# Altium integrated library all_in_one_library.IntLib: 677 symbols (part 2 of 3) (continued)
## RES_1k5_5%_0805
designator R?, comment value 1k5  (hidden comment: Thick film)
1500.00; Tolerance [%]: ±5; Power Rating [W]: 0.1; Case [EIA]: 0805; Case [Metric]: 2012; Value [Ω]: 1500.00
footprint RES_0805
pins: 1, 2
1 alternate drawing of the same symbol

## RES_1k6_5%_0603
designator R?, comment value 1k6  (hidden comment: Thick film)
1600.00; Tolerance [%]: ±5; Power Rating [W]: 0.1; Case [EIA]: 0603; Case [Metric]: 1608; Value [Ω]: 1600.00
footprint RES_0603
pins: 1, 2
1 alternate drawing of the same symbol

## RES_1k6_5%_0805
designator R?, comment value 1k6  (hidden comment: Thick film)
1600.00; Tolerance [%]: ±5; Power Rating [W]: 0.1; Case [EIA]: 0805; Case [Metric]: 2012; Value [Ω]: 1600.00
footprint RES_0805
pins: 1, 2
1 alternate drawing of the same symbol

## RES_1k8_5%_0603
designator R?, comment value 1k8  (hidden comment: Thick film)
1800.00; Tolerance [%]: ±5; Power Rating [W]: 0.1; Case [EIA]: 0603; Case [Metric]: 1608; Value [Ω]: 1800.00
footprint RES_0603
pins: 1, 2
1 alternate drawing of the same symbol

## RES_1k8_5%_0805
designator R?, comment value 1k8  (hidden comment: Thick film)
1800.00; Tolerance [%]: ±5; Power Rating [W]: 0.1; Case [EIA]: 0805; Case [Metric]: 2012; Value [Ω]: 1800.00
footprint RES_0805
pins: 1, 2
1 alternate drawing of the same symbol

## RES_1M5_1%_2512
designator R?, comment 1M5 1W
1500000.00
footprint RES_2512
footprint RES_2512_Cool
pins: 1, 2
1 alternate drawing of the same symbol

## RES_1M_5%_0603
designator R?, comment value 1M  (hidden comment: Thick film)
1000000.00; Tolerance [%]: ±5; Power Rating [W]: 0.1; Case [EIA]: 0603; Case [Metric]: 1608; Value [Ω]: 1000000.00
footprint RES_0603
pins: 1, 2
1 alternate drawing of the same symbol

## RES_1M_5%_0805
designator R?, comment value 1M  (hidden comment: Thick film)
1000000.00; Tolerance [%]: ±5; Power Rating [W]: 0.1; Case [EIA]: 0805; Case [Metric]: 2012; Value [Ω]: 1000000.00
footprint RES_0805
pins: 1, 2
1 alternate drawing of the same symbol

## RES_1R0_5%_0603
designator R?, comment value 1R  (hidden comment: Thick film)
1.00; Tolerance [%]: ±5; Power Rating [W]: 0.1; Case [EIA]: 0603; Case [Metric]: 1608; Value [Ω]: 1.00
footprint RES_0603
pins: 1, 2
1 alternate drawing of the same symbol

## RES_1R0_5%_0805
designator R?, comment value 1R  (hidden comment: Thick film)
1.00; Tolerance [%]: ±5; Power Rating [W]: 0.1; Case [EIA]: 0805; Case [Metric]: 2012; Value [Ω]: 1.00
footprint RES_0805
pins: 1, 2
1 alternate drawing of the same symbol

## RES_1R1_5%_0603
designator R?, comment value 1R1  (hidden comment: Thick film)
1.10; Tolerance [%]: ±5; Power Rating [W]: 0.1; Case [EIA]: 0603; Case [Metric]: 1608; Value [Ω]: 1.10
footprint RES_0603
pins: 1, 2
1 alternate drawing of the same symbol

## RES_1R1_5%_0805
designator R?, comment value 1R1  (hidden comment: Thick film)
1.10; Tolerance [%]: ±5; Power Rating [W]: 0.1; Case [EIA]: 0805; Case [Metric]: 2012; Value [Ω]: 1.10
footprint RES_0805
pins: 1, 2
1 alternate drawing of the same symbol

## RES_1R2_5%_0603
designator R?, comment value 1R2  (hidden comment: Thick film)
1.20; Tolerance [%]: ±5; Power Rating [W]: 0.1; Case [EIA]: 0603; Case [Metric]: 1608; Value [Ω]: 1.20
footprint RES_0603
pins: 1, 2
1 alternate drawing of the same symbol

## RES_1R2_5%_0805
designator R?, comment value 1R2  (hidden comment: Thick film)
1.20; Tolerance [%]: ±5; Power Rating [W]: 0.1; Case [EIA]: 0805; Case [Metric]: 2012; Value [Ω]: 1.20
footprint RES_0805
pins: 1, 2
1 alternate drawing of the same symbol

## RES_1R3_5%_0603
designator R?, comment value 1R3  (hidden comment: Thick film)
1.30; Tolerance [%]: ±5; Power Rating [W]: 0.1; Case [EIA]: 0603; Case [Metric]: 1608; Value [Ω]: 1.30
footprint RES_0603
pins: 1, 2
1 alternate drawing of the same symbol

## RES_1R3_5%_0805
designator R?, comment value 1R3  (hidden comment: Thick film)
1.30; Tolerance [%]: ±5; Power Rating [W]: 0.1; Case [EIA]: 0805; Case [Metric]: 2012; Value [Ω]: 1.30
footprint RES_0805
pins: 1, 2
1 alternate drawing of the same symbol

## RES_1R5_5%_0603
designator R?, comment value 1R5  (hidden comment: Thick film)
1.50; Tolerance [%]: ±5; Power Rating [W]: 0.1; Case [EIA]: 0603; Case [Metric]: 1608; Value [Ω]: 1.50
footprint RES_0603
pins: 1, 2
1 alternate drawing of the same symbol

## RES_1R5_5%_0805
designator R?, comment value 1R5  (hidden comment: Thick film)
1.50; Tolerance [%]: ±5; Power Rating [W]: 0.1; Case [EIA]: 0805; Case [Metric]: 2012; Value [Ω]: 1.50
footprint RES_0805
pins: 1, 2
1 alternate drawing of the same symbol

## RES_1R6_5%_0603
designator R?, comment value 1R6  (hidden comment: Thick film)
1.60; Tolerance [%]: ±5; Power Rating [W]: 0.1; Case [EIA]: 0603; Case [Metric]: 1608; Value [Ω]: 1.60
footprint RES_0603
pins: 1, 2
1 alternate drawing of the same symbol

## RES_1R6_5%_0805
designator R?, comment value 1R6  (hidden comment: Thick film)
1.60; Tolerance [%]: ±5; Power Rating [W]: 0.1; Case [EIA]: 0805; Case [Metric]: 2012; Value [Ω]: 1.60
footprint RES_0805
pins: 1, 2
1 alternate drawing of the same symbol

## RES_1R8_5%_0603
designator R?, comment value 1R8  (hidden comment: Thick film)
1.80; Tolerance [%]: ±5; Power Rating [W]: 0.1; Case [EIA]: 0603; Case [Metric]: 1608; Value [Ω]: 1.80
footprint RES_0603
pins: 1, 2
1 alternate drawing of the same symbol

## RES_1R8_5%_0805
designator R?, comment value 1R8  (hidden comment: Thick film)
1.80; Tolerance [%]: ±5; Power Rating [W]: 0.1; Case [EIA]: 0805; Case [Metric]: 2012; Value [Ω]: 1.80
footprint RES_0805
pins: 1, 2
1 alternate drawing of the same symbol

## RES_2k0_5%_0603
designator R?, comment value 2k  (hidden comment: Thick film)
2000.00; Tolerance [%]: ±5; Power Rating [W]: 0.1; Case [EIA]: 0603; Case [Metric]: 1608; Value [Ω]: 2000.00
footprint RES_0603
pins: 1, 2
1 alternate drawing of the same symbol

## RES_2k0_5%_0805
designator R?, comment value 2k  (hidden comment: Thick film)
2000.00; Tolerance [%]: ±5; Power Rating [W]: 0.1; Case [EIA]: 0805; Case [Metric]: 2012; Value [Ω]: 2000.00
footprint RES_0805
pins: 1, 2
1 alternate drawing of the same symbol

## RES_2k2_5%_0603
designator R?, comment value 2k2  (hidden comment: Thick film)
2200.00; Tolerance [%]: ±5; Power Rating [W]: 0.1; Case [EIA]: 0603; Case [Metric]: 1608; Value [Ω]: 2200.00
footprint RES_0603
pins: 1, 2
1 alternate drawing of the same symbol

## RES_2k2_5%_0805
designator R?, comment value 2k2  (hidden comment: Thick film)
2200.00; Tolerance [%]: ±5; Power Rating [W]: 0.1; Case [EIA]: 0805; Case [Metric]: 2012; Value [Ω]: 2200.00
footprint RES_0805
pins: 1, 2
1 alternate drawing of the same symbol

## RES_2k4_5%_0603
designator R?, comment value 2k4  (hidden comment: Thick film)
2400.00; Tolerance [%]: ±5; Power Rating [W]: 0.1; Case [EIA]: 0603; Case [Metric]: 1608; Value [Ω]: 2400.00
footprint RES_0603
pins: 1, 2
1 alternate drawing of the same symbol

## RES_2k4_5%_0805
designator R?, comment value 2k4  (hidden comment: Thick film)
2400.00; Tolerance [%]: ±5; Power Rating [W]: 0.1; Case [EIA]: 0805; Case [Metric]: 2012; Value [Ω]: 2400.00
footprint RES_0805
pins: 1, 2
1 alternate drawing of the same symbol

## RES_2k7_5%_0603
designator R?, comment value 2k7  (hidden comment: Thick film)
2700.00; Tolerance [%]: ±5; Power Rating [W]: 0.1; Case [EIA]: 0603; Case [Metric]: 1608; Value [Ω]: 2700.00
footprint RES_0603
pins: 1, 2
1 alternate drawing of the same symbol

## RES_2k7_5%_0805
designator R?, comment value 2k7  (hidden comment: Thick film)
2700.00; Tolerance [%]: ±5; Power Rating [W]: 0.1; Case [EIA]: 0805; Case [Metric]: 2012; Value [Ω]: 2700.00
footprint RES_0805
pins: 1, 2
1 alternate drawing of the same symbol

## RES_2R0_5%_0603
designator R?, comment value 2R  (hidden comment: Thick film)
2.00; Tolerance [%]: ±5; Power Rating [W]: 0.1; Case [EIA]: 0603; Case [Metric]: 1608; Value [Ω]: 2.00
footprint RES_0603
pins: 1, 2
1 alternate drawing of the same symbol

## RES_2R0_5%_0805
designator R?, comment value 2R  (hidden comment: Thick film)
2.00; Tolerance [%]: ±5; Power Rating [W]: 0.1; Case [EIA]: 0805; Case [Metric]: 2012; Value [Ω]: 2.00
footprint RES_0805
pins: 1, 2
1 alternate drawing of the same symbol

## RES_2R2_5%_0603
designator R?, comment value 2R2  (hidden comment: Thick film)
2.20; Tolerance [%]: ±5; Power Rating [W]: 0.1; Case [EIA]: 0603; Case [Metric]: 1608; Value [Ω]: 2.20
footprint RES_0603
pins: 1, 2
1 alternate drawing of the same symbol

## RES_2R2_5%_0805
designator R?, comment value 2R2  (hidden comment: Thick film)
2.20; Tolerance [%]: ±5; Power Rating [W]: 0.1; Case [EIA]: 0805; Case [Metric]: 2012; Value [Ω]: 2.20
footprint RES_0805
pins: 1, 2
1 alternate drawing of the same symbol

## RES_2R4_5%_0603
designator R?, comment value 2R4  (hidden comment: Thick film)
2.40; Tolerance [%]: ±5; Power Rating [W]: 0.1; Case [EIA]: 0603; Case [Metric]: 1608; Value [Ω]: 2.40
footprint RES_0603
pins: 1, 2
1 alternate drawing of the same symbol

## RES_2R4_5%_0805
designator R?, comment value 2R4  (hidden comment: Thick film)
2.40; Tolerance [%]: ±5; Power Rating [W]: 0.1; Case [EIA]: 0805; Case [Metric]: 2012; Value [Ω]: 2.40
footprint RES_0805
pins: 1, 2
1 alternate drawing of the same symbol

## RES_2R7_5%_0603
designator R?, comment value 2R7  (hidden comment: Thick film)
2.70; Tolerance [%]: ±5; Power Rating [W]: 0.1; Case [EIA]: 0603; Case [Metric]: 1608; Value [Ω]: 2.70
footprint RES_0603
pins: 1, 2
1 alternate drawing of the same symbol

## RES_2R7_5%_0805
designator R?, comment value 2R7  (hidden comment: Thick film)
2.70; Tolerance [%]: ±5; Power Rating [W]: 0.1; Case [EIA]: 0805; Case [Metric]: 2012; Value [Ω]: 2.70
footprint RES_0805
pins: 1, 2
1 alternate drawing of the same symbol

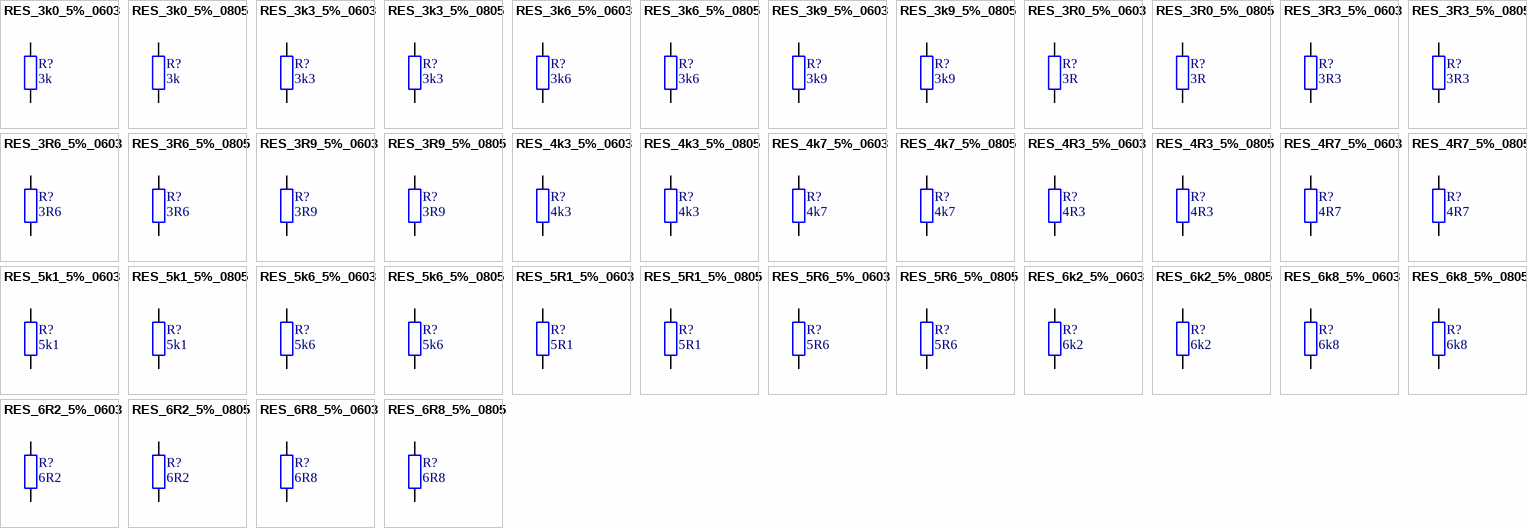
[diagram p10: symbols RES_3k0_5%_0603 to RES_6R8_5%_0805]

## RES_3k0_5%_0603
designator R?, comment value 3k  (hidden comment: Thick film)
3000.00; Tolerance [%]: ±5; Power Rating [W]: 0.1; Case [EIA]: 0603; Case [Metric]: 1608; Value [Ω]: 3000.00
footprint RES_0603
pins: 1, 2
1 alternate drawing of the same symbol

## RES_3k0_5%_0805
designator R?, comment value 3k  (hidden comment: Thick film)
3000.00; Tolerance [%]: ±5; Power Rating [W]: 0.1; Case [EIA]: 0805; Case [Metric]: 2012; Value [Ω]: 3000.00
footprint RES_0805
pins: 1, 2
1 alternate drawing of the same symbol

## RES_3k3_5%_0603
designator R?, comment value 3k3  (hidden comment: Thick film)
3300.00; Tolerance [%]: ±5; Power Rating [W]: 0.1; Case [EIA]: 0603; Case [Metric]: 1608; Value [Ω]: 3300.00
footprint RES_0603
pins: 1, 2
1 alternate drawing of the same symbol

## RES_3k3_5%_0805
designator R?, comment value 3k3  (hidden comment: Thick film)
3300.00; Tolerance [%]: ±5; Power Rating [W]: 0.1; Case [EIA]: 0805; Case [Metric]: 2012; Value [Ω]: 3300.00
footprint RES_0805
pins: 1, 2
1 alternate drawing of the same symbol

## RES_3k6_5%_0603
designator R?, comment value 3k6  (hidden comment: Thick film)
3600.00; Tolerance [%]: ±5; Power Rating [W]: 0.1; Case [EIA]: 0603; Case [Metric]: 1608; Value [Ω]: 3600.00
footprint RES_0603
pins: 1, 2
1 alternate drawing of the same symbol

## RES_3k6_5%_0805
designator R?, comment value 3k6  (hidden comment: Thick film)
3600.00; Tolerance [%]: ±5; Power Rating [W]: 0.1; Case [EIA]: 0805; Case [Metric]: 2012; Value [Ω]: 3600.00
footprint RES_0805
pins: 1, 2
1 alternate drawing of the same symbol

## RES_3k9_5%_0603
designator R?, comment value 3k9  (hidden comment: Thick film)
3900.00; Tolerance [%]: ±5; Power Rating [W]: 0.1; Case [EIA]: 0603; Case [Metric]: 1608; Value [Ω]: 3900.00
footprint RES_0603
pins: 1, 2
1 alternate drawing of the same symbol

## RES_3k9_5%_0805
designator R?, comment value 3k9  (hidden comment: Thick film)
3900.00; Tolerance [%]: ±5; Power Rating [W]: 0.1; Case [EIA]: 0805; Case [Metric]: 2012; Value [Ω]: 3900.00
footprint RES_0805
pins: 1, 2
1 alternate drawing of the same symbol

## RES_3R0_5%_0603
designator R?, comment value 3R  (hidden comment: Thick film)
3.00; Tolerance [%]: ±5; Power Rating [W]: 0.1; Case [EIA]: 0603; Case [Metric]: 1608; Value [Ω]: 3.00
footprint RES_0603
pins: 1, 2
1 alternate drawing of the same symbol

## RES_3R0_5%_0805
designator R?, comment value 3R  (hidden comment: Thick film)
3.00; Tolerance [%]: ±5; Power Rating [W]: 0.1; Case [EIA]: 0805; Case [Metric]: 2012; Value [Ω]: 3.00
footprint RES_0805
pins: 1, 2
1 alternate drawing of the same symbol

## RES_3R3_5%_0603
designator R?, comment value 3R3  (hidden comment: Thick film)
3.30; Tolerance [%]: ±5; Power Rating [W]: 0.1; Case [EIA]: 0603; Case [Metric]: 1608; Value [Ω]: 3.30
footprint RES_0603
pins: 1, 2
1 alternate drawing of the same symbol

## RES_3R3_5%_0805
designator R?, comment value 3R3  (hidden comment: Thick film)
3.30; Tolerance [%]: ±5; Power Rating [W]: 0.1; Case [EIA]: 0805; Case [Metric]: 2012; Value [Ω]: 3.30
footprint RES_0805
pins: 1, 2
1 alternate drawing of the same symbol

## RES_3R6_5%_0603
designator R?, comment value 3R6  (hidden comment: Thick film)
3.60; Tolerance [%]: ±5; Power Rating [W]: 0.1; Case [EIA]: 0603; Case [Metric]: 1608; Value [Ω]: 3.60
footprint RES_0603
pins: 1, 2
1 alternate drawing of the same symbol

## RES_3R6_5%_0805
designator R?, comment value 3R6  (hidden comment: Thick film)
3.60; Tolerance [%]: ±5; Power Rating [W]: 0.1; Case [EIA]: 0805; Case [Metric]: 2012; Value [Ω]: 3.60
footprint RES_0805
pins: 1, 2
1 alternate drawing of the same symbol

## RES_3R9_5%_0603
designator R?, comment value 3R9  (hidden comment: Thick film)
3.90; Tolerance [%]: ±5; Power Rating [W]: 0.1; Case [EIA]: 0603; Case [Metric]: 1608; Value [Ω]: 3.90
footprint RES_0603
pins: 1, 2
1 alternate drawing of the same symbol

## RES_3R9_5%_0805
designator R?, comment value 3R9  (hidden comment: Thick film)
3.90; Tolerance [%]: ±5; Power Rating [W]: 0.1; Case [EIA]: 0805; Case [Metric]: 2012; Value [Ω]: 3.90
footprint RES_0805
pins: 1, 2
1 alternate drawing of the same symbol

## RES_4k3_5%_0603
designator R?, comment value 4k3  (hidden comment: Thick film)
4300.00; Tolerance [%]: ±5; Power Rating [W]: 0.1; Case [EIA]: 0603; Case [Metric]: 1608; Value [Ω]: 4300.00
footprint RES_0603
pins: 1, 2
1 alternate drawing of the same symbol

## RES_4k3_5%_0805
designator R?, comment value 4k3  (hidden comment: Thick film)
4300.00; Tolerance [%]: ±5; Power Rating [W]: 0.1; Case [EIA]: 0805; Case [Metric]: 2012; Value [Ω]: 4300.00
footprint RES_0805
pins: 1, 2
1 alternate drawing of the same symbol

## RES_4k7_5%_0603
designator R?, comment value 4k7  (hidden comment: Thick film)
4700.00; Tolerance [%]: ±5; Power Rating [W]: 0.1; Case [EIA]: 0603; Case [Metric]: 1608; Value [Ω]: 4700.00
footprint RES_0603
pins: 1, 2
1 alternate drawing of the same symbol

## RES_4k7_5%_0805
designator R?, comment value 4k7  (hidden comment: Thick film)
4700.00; Tolerance [%]: ±5; Power Rating [W]: 0.1; Case [EIA]: 0805; Case [Metric]: 2012; Value [Ω]: 4700.00
footprint RES_0805
pins: 1, 2
1 alternate drawing of the same symbol

## RES_4R3_5%_0603
designator R?, comment value 4R3  (hidden comment: Thick film)
4.30; Tolerance [%]: ±5; Power Rating [W]: 0.1; Case [EIA]: 0603; Case [Metric]: 1608; Value [Ω]: 4.30
footprint RES_0603
pins: 1, 2
1 alternate drawing of the same symbol

## RES_4R3_5%_0805
designator R?, comment value 4R3  (hidden comment: Thick film)
4.30; Tolerance [%]: ±5; Power Rating [W]: 0.1; Case [EIA]: 0805; Case [Metric]: 2012; Value [Ω]: 4.30
footprint RES_0805
pins: 1, 2
1 alternate drawing of the same symbol

## RES_4R7_5%_0603
designator R?, comment value 4R7  (hidden comment: Thick film)
4.70; Tolerance [%]: ±5; Power Rating [W]: 0.1; Case [EIA]: 0603; Case [Metric]: 1608; Value [Ω]: 4.70
footprint RES_0603
pins: 1, 2
1 alternate drawing of the same symbol

## RES_4R7_5%_0805
designator R?, comment value 4R7  (hidden comment: Thick film)
4.70; Tolerance [%]: ±5; Power Rating [W]: 0.1; Case [EIA]: 0805; Case [Metric]: 2012; Value [Ω]: 4.70
footprint RES_0805
pins: 1, 2
1 alternate drawing of the same symbol

## RES_5k1_5%_0603
designator R?, comment value 5k1  (hidden comment: Thick film)
5100.00; Tolerance [%]: ±5; Power Rating [W]: 0.1; Case [EIA]: 0603; Case [Metric]: 1608; Value [Ω]: 5100.00
footprint RES_0603
pins: 1, 2
1 alternate drawing of the same symbol

## RES_5k1_5%_0805
designator R?, comment value 5k1  (hidden comment: Thick film)
5100.00; Tolerance [%]: ±5; Power Rating [W]: 0.1; Case [EIA]: 0805; Case [Metric]: 2012; Value [Ω]: 5100.00
footprint RES_0805
pins: 1, 2
1 alternate drawing of the same symbol

## RES_5k6_5%_0603
designator R?, comment value 5k6  (hidden comment: Thick film)
5600.00; Tolerance [%]: ±5; Power Rating [W]: 0.1; Case [EIA]: 0603; Case [Metric]: 1608; Value [Ω]: 5600.00
footprint RES_0603
pins: 1, 2
1 alternate drawing of the same symbol

## RES_5k6_5%_0805
designator R?, comment value 5k6  (hidden comment: Thick film)
5600.00; Tolerance [%]: ±5; Power Rating [W]: 0.1; Case [EIA]: 0805; Case [Metric]: 2012; Value [Ω]: 5600.00
footprint RES_0805
pins: 1, 2
1 alternate drawing of the same symbol

## RES_5R1_5%_0603
designator R?, comment value 5R1  (hidden comment: Thick film)
5.10; Tolerance [%]: ±5; Power Rating [W]: 0.1; Case [EIA]: 0603; Case [Metric]: 1608; Value [Ω]: 5.10
footprint RES_0603
pins: 1, 2
1 alternate drawing of the same symbol

## RES_5R1_5%_0805
designator R?, comment value 5R1  (hidden comment: Thick film)
5.10; Tolerance [%]: ±5; Power Rating [W]: 0.1; Case [EIA]: 0805; Case [Metric]: 2012; Value [Ω]: 5.10
footprint RES_0805
pins: 1, 2
1 alternate drawing of the same symbol

## RES_5R6_5%_0603
designator R?, comment value 5R6  (hidden comment: Thick film)
5.60; Tolerance [%]: ±5; Power Rating [W]: 0.1; Case [EIA]: 0603; Case [Metric]: 1608; Value [Ω]: 5.60
footprint RES_0603
pins: 1, 2
1 alternate drawing of the same symbol

## RES_5R6_5%_0805
designator R?, comment value 5R6  (hidden comment: Thick film)
5.60; Tolerance [%]: ±5; Power Rating [W]: 0.1; Case [EIA]: 0805; Case [Metric]: 2012; Value [Ω]: 5.60
footprint RES_0805
pins: 1, 2
1 alternate drawing of the same symbol

## RES_6k2_5%_0603
designator R?, comment value 6k2  (hidden comment: Thick film)
6200.00; Tolerance [%]: ±5; Power Rating [W]: 0.1; Case [EIA]: 0603; Case [Metric]: 1608; Value [Ω]: 6200.00
footprint RES_0603
pins: 1, 2
1 alternate drawing of the same symbol

## RES_6k2_5%_0805
designator R?, comment value 6k2  (hidden comment: Thick film)
6200.00; Tolerance [%]: ±5; Power Rating [W]: 0.1; Case [EIA]: 0805; Case [Metric]: 2012; Value [Ω]: 6200.00
footprint RES_0805
pins: 1, 2
1 alternate drawing of the same symbol

## RES_6k8_5%_0603
designator R?, comment value 6k8  (hidden comment: Thick film)
6800.00; Tolerance [%]: ±5; Power Rating [W]: 0.1; Case [EIA]: 0603; Case [Metric]: 1608; Value [Ω]: 6800.00
footprint RES_0603
pins: 1, 2
1 alternate drawing of the same symbol

## RES_6k8_5%_0805
designator R?, comment value 6k8  (hidden comment: Thick film)
6800.00; Tolerance [%]: ±5; Power Rating [W]: 0.1; Case [EIA]: 0805; Case [Metric]: 2012; Value [Ω]: 6800.00
footprint RES_0805
pins: 1, 2
1 alternate drawing of the same symbol

## RES_6R2_5%_0603
designator R?, comment value 6R2  (hidden comment: Thick film)
6.20; Tolerance [%]: ±5; Power Rating [W]: 0.1; Case [EIA]: 0603; Case [Metric]: 1608; Value [Ω]: 6.20
footprint RES_0603
pins: 1, 2
1 alternate drawing of the same symbol

## RES_6R2_5%_0805
designator R?, comment value 6R2  (hidden comment: Thick film)
6.20; Tolerance [%]: ±5; Power Rating [W]: 0.1; Case [EIA]: 0805; Case [Metric]: 2012; Value [Ω]: 6.20
footprint RES_0805
pins: 1, 2
1 alternate drawing of the same symbol

## RES_6R8_5%_0603
designator R?, comment value 6R8  (hidden comment: Thick film)
6.80; Tolerance [%]: ±5; Power Rating [W]: 0.1; Case [EIA]: 0603; Case [Metric]: 1608; Value [Ω]: 6.80
footprint RES_0603
pins: 1, 2
1 alternate drawing of the same symbol

## RES_6R8_5%_0805
designator R?, comment value 6R8  (hidden comment: Thick film)
6.80; Tolerance [%]: ±5; Power Rating [W]: 0.1; Case [EIA]: 0805; Case [Metric]: 2012; Value [Ω]: 6.80
footprint RES_0805
pins: 1, 2
1 alternate drawing of the same symbol

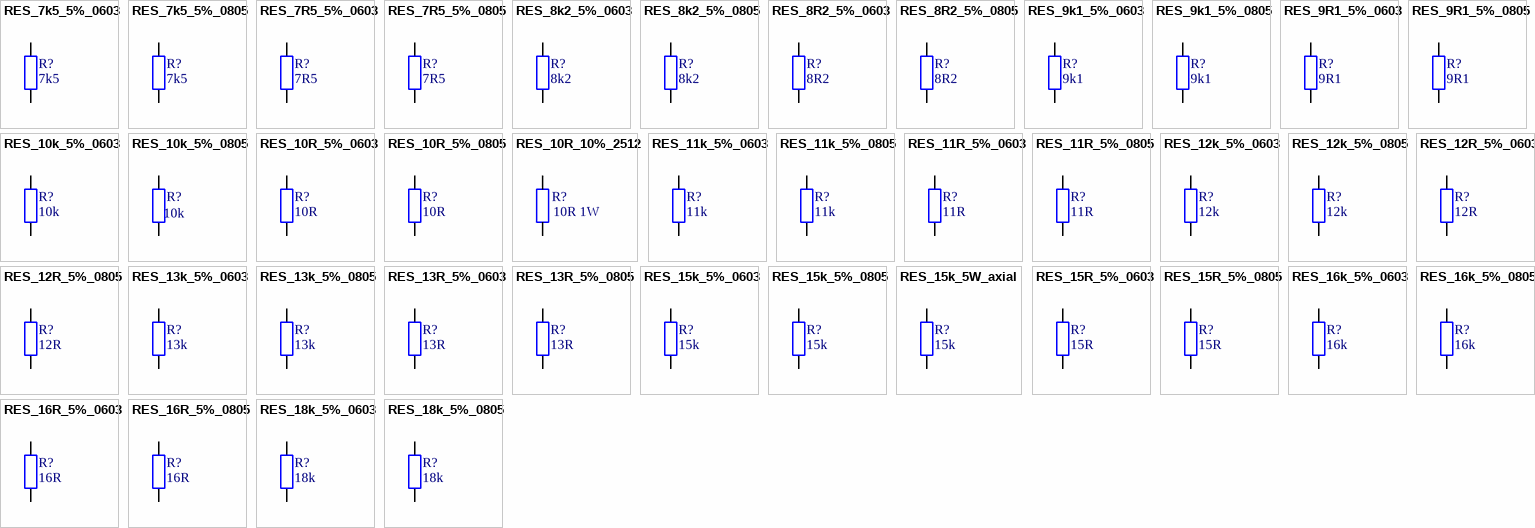
[diagram p11: symbols RES_7k5_5%_0603 to RES_18k_5%_0805]

## RES_7k5_5%_0603
designator R?, comment value 7k5  (hidden comment: Thick film)
7500.00; Tolerance [%]: ±5; Power Rating [W]: 0.1; Case [EIA]: 0603; Case [Metric]: 1608; Value [Ω]: 7500.00
footprint RES_0603
pins: 1, 2
1 alternate drawing of the same symbol

## RES_7k5_5%_0805
designator R?, comment value 7k5  (hidden comment: Thick film)
7500.00; Tolerance [%]: ±5; Power Rating [W]: 0.1; Case [EIA]: 0805; Case [Metric]: 2012; Value [Ω]: 7500.00
footprint RES_0805
pins: 1, 2
1 alternate drawing of the same symbol

## RES_7R5_5%_0603
designator R?, comment value 7R5  (hidden comment: Thick film)
7.50; Tolerance [%]: ±5; Power Rating [W]: 0.1; Case [EIA]: 0603; Case [Metric]: 1608; Value [Ω]: 7.50
footprint RES_0603
pins: 1, 2
1 alternate drawing of the same symbol

## RES_7R5_5%_0805
designator R?, comment value 7R5  (hidden comment: Thick film)
7.50; Tolerance [%]: ±5; Power Rating [W]: 0.1; Case [EIA]: 0805; Case [Metric]: 2012; Value [Ω]: 7.50
footprint RES_0805
pins: 1, 2
1 alternate drawing of the same symbol

## RES_8k2_5%_0603
designator R?, comment value 8k2  (hidden comment: Thick film)
8200.00; Tolerance [%]: ±5; Power Rating [W]: 0.1; Case [EIA]: 0603; Case [Metric]: 1608; Value [Ω]: 8200.00
footprint RES_0603
pins: 1, 2
1 alternate drawing of the same symbol

## RES_8k2_5%_0805
designator R?, comment value 8k2  (hidden comment: Thick film)
8200.00; Tolerance [%]: ±5; Power Rating [W]: 0.1; Case [EIA]: 0805; Case [Metric]: 2012; Value [Ω]: 8200.00
footprint RES_0805
pins: 1, 2
1 alternate drawing of the same symbol

## RES_8R2_5%_0603
designator R?, comment value 8R2  (hidden comment: Thick film)
8.20; Tolerance [%]: ±5; Power Rating [W]: 0.1; Case [EIA]: 0603; Case [Metric]: 1608; Value [Ω]: 8.20
footprint RES_0603
pins: 1, 2
1 alternate drawing of the same symbol

## RES_8R2_5%_0805
designator R?, comment value 8R2  (hidden comment: Thick film)
8.20; Tolerance [%]: ±5; Power Rating [W]: 0.1; Case [EIA]: 0805; Case [Metric]: 2012; Value [Ω]: 8.20
footprint RES_0805
pins: 1, 2
1 alternate drawing of the same symbol

## RES_9k1_5%_0603
designator R?, comment value 9k1  (hidden comment: Thick film)
9100.00; Tolerance [%]: ±5; Power Rating [W]: 0.1; Case [EIA]: 0603; Case [Metric]: 1608; Value [Ω]: 9100.00
footprint RES_0603
pins: 1, 2
1 alternate drawing of the same symbol

## RES_9k1_5%_0805
designator R?, comment value 9k1  (hidden comment: Thick film)
9100.00; Tolerance [%]: ±5; Power Rating [W]: 0.1; Case [EIA]: 0805; Case [Metric]: 2012; Value [Ω]: 9100.00
footprint RES_0805
pins: 1, 2
1 alternate drawing of the same symbol

## RES_9R1_5%_0603
designator R?, comment value 9R1  (hidden comment: Thick film)
9.10; Tolerance [%]: ±5; Power Rating [W]: 0.1; Case [EIA]: 0603; Case [Metric]: 1608; Value [Ω]: 9.10
footprint RES_0603
pins: 1, 2
1 alternate drawing of the same symbol

## RES_9R1_5%_0805
designator R?, comment value 9R1  (hidden comment: Thick film)
9.10; Tolerance [%]: ±5; Power Rating [W]: 0.1; Case [EIA]: 0805; Case [Metric]: 2012; Value [Ω]: 9.10
footprint RES_0805
pins: 1, 2
1 alternate drawing of the same symbol

## RES_10k_5%_0603
designator R?, comment value 10k  (hidden comment: Thick film)
10000.00; Tolerance [%]: ±5; Power Rating [W]: 0.1; Case [EIA]: 0603; Case [Metric]: 1608; Value [Ω]: 10000.00
footprint RES_0603
pins: 1, 2
1 alternate drawing of the same symbol

## RES_10k_5%_0805
designator R?, comment value 10k  (hidden comment: Thick film)
10000.00; Tolerance [%]: ±5; Power Rating [W]: 0.1; Case [EIA]: 0805; Case [Metric]: 2012; Value [Ω]: 10000.00
footprint RES_0805
pins: 1, 2
1 alternate drawing of the same symbol

## RES_10R_5%_0603
designator R?, comment value 10R  (hidden comment: Thick film)
10.00; Tolerance [%]: ±5; Power Rating [W]: 0.1; Case [EIA]: 0603; Case [Metric]: 1608; Value [Ω]: 10.00
footprint RES_0603
pins: 1, 2
1 alternate drawing of the same symbol

## RES_10R_5%_0805
designator R?, comment value 10R  (hidden comment: Thick film)
10.00; Tolerance [%]: ±5; Power Rating [W]: 0.1; Case [EIA]: 0805; Case [Metric]: 2012; Value [Ω]: 10.00
footprint RES_0805
pins: 1, 2
1 alternate drawing of the same symbol

## RES_10R_10%_2512
designator R?, comment 10R 1W
10.00
footprint RES_2512
footprint RES_2512_Cool
pins: 1, 2
1 alternate drawing of the same symbol

## RES_11k_5%_0603
designator R?, comment value 11k  (hidden comment: Thick film)
11000.00; Tolerance [%]: ±5; Power Rating [W]: 0.1; Case [EIA]: 0603; Case [Metric]: 1608; Value [Ω]: 11000.00
footprint RES_0603
pins: 1, 2
1 alternate drawing of the same symbol

## RES_11k_5%_0805
designator R?, comment value 11k  (hidden comment: Thick film)
11000.00; Tolerance [%]: ±5; Power Rating [W]: 0.1; Case [EIA]: 0805; Case [Metric]: 2012; Value [Ω]: 11000.00
footprint RES_0805
pins: 1, 2
1 alternate drawing of the same symbol

## RES_11R_5%_0603
designator R?, comment value 11R  (hidden comment: Thick film)
11.00; Tolerance [%]: ±5; Power Rating [W]: 0.1; Case [EIA]: 0603; Case [Metric]: 1608; Value [Ω]: 11.00
footprint RES_0603
pins: 1, 2
1 alternate drawing of the same symbol

## RES_11R_5%_0805
designator R?, comment value 11R  (hidden comment: Thick film)
11.00; Tolerance [%]: ±5; Power Rating [W]: 0.1; Case [EIA]: 0805; Case [Metric]: 2012; Value [Ω]: 11.00
footprint RES_0805
pins: 1, 2
1 alternate drawing of the same symbol

## RES_12k_5%_0603
designator R?, comment value 12k  (hidden comment: Thick film)
12000.00; Tolerance [%]: ±5; Power Rating [W]: 0.1; Case [EIA]: 0603; Case [Metric]: 1608; Value [Ω]: 12000.00
footprint RES_0603
pins: 1, 2
1 alternate drawing of the same symbol

## RES_12k_5%_0805
designator R?, comment value 12k  (hidden comment: Thick film)
12000.00; Tolerance [%]: ±5; Power Rating [W]: 0.1; Case [EIA]: 0805; Case [Metric]: 2012; Value [Ω]: 12000.00
footprint RES_0805
pins: 1, 2
1 alternate drawing of the same symbol

## RES_12R_5%_0603
designator R?, comment value 12R  (hidden comment: Thick film)
12.00; Tolerance [%]: ±5; Power Rating [W]: 0.1; Case [EIA]: 0603; Case [Metric]: 1608; Value [Ω]: 12.00
footprint RES_0603
pins: 1, 2
1 alternate drawing of the same symbol

## RES_12R_5%_0805
designator R?, comment value 12R  (hidden comment: Thick film)
12.00; Tolerance [%]: ±5; Power Rating [W]: 0.1; Case [EIA]: 0805; Case [Metric]: 2012; Value [Ω]: 12.00
footprint RES_0805
pins: 1, 2
1 alternate drawing of the same symbol

## RES_13k_5%_0603
designator R?, comment value 13k  (hidden comment: Thick film)
13000.00; Tolerance [%]: ±5; Power Rating [W]: 0.1; Case [EIA]: 0603; Case [Metric]: 1608; Value [Ω]: 13000.00
footprint RES_0603
pins: 1, 2
1 alternate drawing of the same symbol

## RES_13k_5%_0805
designator R?, comment value 13k  (hidden comment: Thick film)
13000.00; Tolerance [%]: ±5; Power Rating [W]: 0.1; Case [EIA]: 0805; Case [Metric]: 2012; Value [Ω]: 13000.00
footprint RES_0805
pins: 1, 2
1 alternate drawing of the same symbol

## RES_13R_5%_0603
designator R?, comment value 13R  (hidden comment: Thick film)
13.00; Tolerance [%]: ±5; Power Rating [W]: 0.1; Case [EIA]: 0603; Case [Metric]: 1608; Value [Ω]: 13.00
footprint RES_0603
pins: 1, 2
1 alternate drawing of the same symbol

## RES_13R_5%_0805
designator R?, comment value 13R  (hidden comment: Thick film)
13.00; Tolerance [%]: ±5; Power Rating [W]: 0.1; Case [EIA]: 0805; Case [Metric]: 2012; Value [Ω]: 13.00
footprint RES_0805
pins: 1, 2
1 alternate drawing of the same symbol

## RES_15k_5%_0603
designator R?, comment value 15k  (hidden comment: Thick film)
15000.00; Tolerance [%]: ±5; Power Rating [W]: 0.1; Case [EIA]: 0603; Case [Metric]: 1608; Value [Ω]: 15000.00
footprint RES_0603
pins: 1, 2
1 alternate drawing of the same symbol

## RES_15k_5%_0805
designator R?, comment value 15k  (hidden comment: Thick film)
15000.00; Tolerance [%]: ±5; Power Rating [W]: 0.1; Case [EIA]: 0805; Case [Metric]: 2012; Value [Ω]: 15000.00
footprint RES_0805
pins: 1, 2
1 alternate drawing of the same symbol

## RES_15k_5W_axial
designator R?, comment value 15k  (hidden comment: MetalOxid)
15000.00; Tolerance [%]: ±1; Power Rating [W]: 5; Case [Metric]: 2012; Value [Ω]: 15000.00
footprint RES_5W_AXIAL (Vishay)
pins: 1, 2
1 alternate drawing of the same symbol

## RES_15R_5%_0603
designator R?, comment value 15R  (hidden comment: Thick film)
15.00; Tolerance [%]: ±5; Power Rating [W]: 0.1; Case [EIA]: 0603; Case [Metric]: 1608; Value [Ω]: 15.00
footprint RES_0603
pins: 1, 2
1 alternate drawing of the same symbol

## RES_15R_5%_0805
designator R?, comment value 15R  (hidden comment: Thick film)
15.00; Tolerance [%]: ±5; Power Rating [W]: 0.1; Case [EIA]: 0805; Case [Metric]: 2012; Value [Ω]: 15.00
footprint RES_0805
pins: 1, 2
1 alternate drawing of the same symbol

## RES_16k_5%_0603
designator R?, comment value 16k  (hidden comment: Thick film)
16000.00; Tolerance [%]: ±5; Power Rating [W]: 0.1; Case [EIA]: 0603; Case [Metric]: 1608; Value [Ω]: 16000.00
footprint RES_0603
pins: 1, 2
1 alternate drawing of the same symbol

## RES_16k_5%_0805
designator R?, comment value 16k  (hidden comment: Thick film)
16000.00; Tolerance [%]: ±5; Power Rating [W]: 0.1; Case [EIA]: 0805; Case [Metric]: 2012; Value [Ω]: 16000.00
footprint RES_0805
pins: 1, 2
1 alternate drawing of the same symbol

## RES_16R_5%_0603
designator R?, comment value 16R  (hidden comment: Thick film)
16.00; Tolerance [%]: ±5; Power Rating [W]: 0.1; Case [EIA]: 0603; Case [Metric]: 1608; Value [Ω]: 16.00
footprint RES_0603
pins: 1, 2
1 alternate drawing of the same symbol

## RES_16R_5%_0805
designator R?, comment value 16R  (hidden comment: Thick film)
16.00; Tolerance [%]: ±5; Power Rating [W]: 0.1; Case [EIA]: 0805; Case [Metric]: 2012; Value [Ω]: 16.00
footprint RES_0805
pins: 1, 2
1 alternate drawing of the same symbol

## RES_18k_5%_0603
designator R?, comment value 18k  (hidden comment: Thick film)
18000.00; Tolerance [%]: ±5; Power Rating [W]: 0.1; Case [EIA]: 0603; Case [Metric]: 1608; Value [Ω]: 18000.00
footprint RES_0603
pins: 1, 2
1 alternate drawing of the same symbol

## RES_18k_5%_0805
designator R?, comment value 18k  (hidden comment: Thick film)
18000.00; Tolerance [%]: ±5; Power Rating [W]: 0.1; Case [EIA]: 0805; Case [Metric]: 2012; Value [Ω]: 18000.00
footprint RES_0805
pins: 1, 2
1 alternate drawing of the same symbol

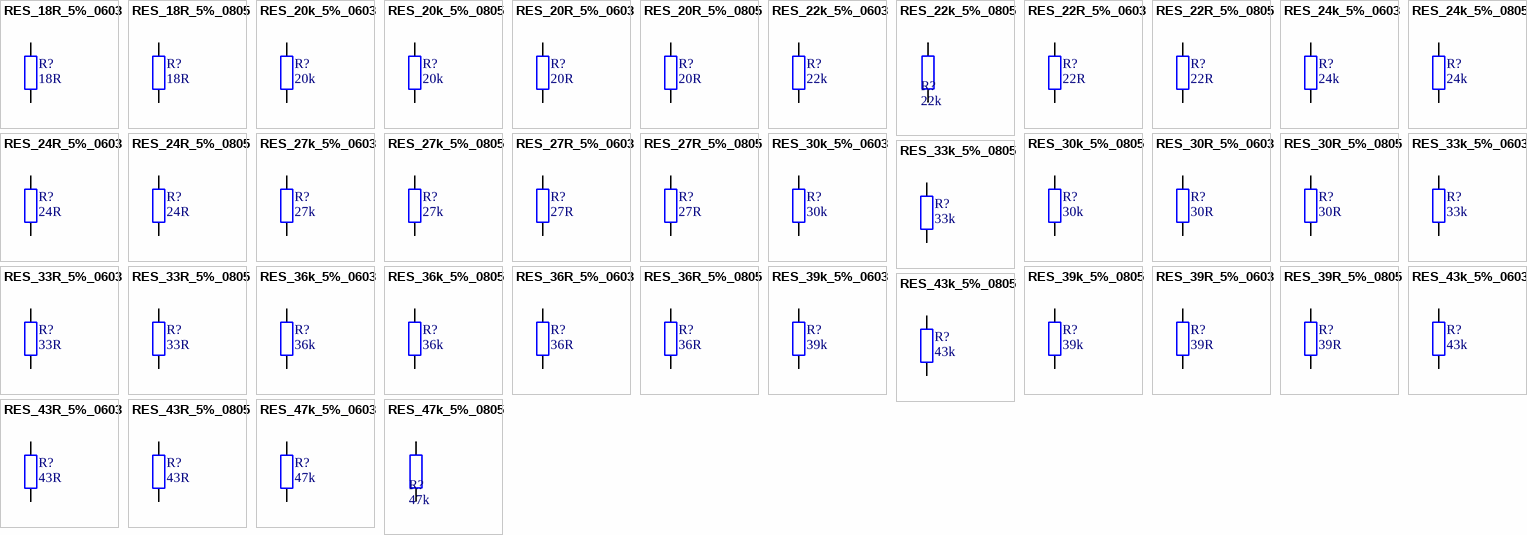
[diagram p12: symbols RES_18R_5%_0603 to RES_47k_5%_0805]

## RES_18R_5%_0603
designator R?, comment value 18R  (hidden comment: Thick film)
18.00; Tolerance [%]: ±5; Power Rating [W]: 0.1; Case [EIA]: 0603; Case [Metric]: 1608; Value [Ω]: 18.00
footprint RES_0603
pins: 1, 2
1 alternate drawing of the same symbol

## RES_18R_5%_0805
designator R?, comment value 18R  (hidden comment: Thick film)
18.00; Tolerance [%]: ±5; Power Rating [W]: 0.1; Case [EIA]: 0805; Case [Metric]: 2012; Value [Ω]: 18.00
footprint RES_0805
pins: 1, 2
1 alternate drawing of the same symbol

## RES_20k_5%_0603
designator R?, comment value 20k  (hidden comment: Thick film)
20000.00; Tolerance [%]: ±5; Power Rating [W]: 0.1; Case [EIA]: 0603; Case [Metric]: 1608; Value [Ω]: 20000.00
footprint RES_0603
pins: 1, 2
1 alternate drawing of the same symbol

## RES_20k_5%_0805
designator R?, comment value 20k  (hidden comment: Thick film)
20000.00; Tolerance [%]: ±5; Power Rating [W]: 0.1; Case [EIA]: 0805; Case [Metric]: 2012; Value [Ω]: 20000.00
footprint RES_0805
pins: 1, 2
1 alternate drawing of the same symbol

## RES_20R_5%_0603
designator R?, comment value 20R  (hidden comment: Thick film)
20.00; Tolerance [%]: ±5; Power Rating [W]: 0.1; Case [EIA]: 0603; Case [Metric]: 1608; Value [Ω]: 20.00
footprint RES_0603
pins: 1, 2
1 alternate drawing of the same symbol

## RES_20R_5%_0805
designator R?, comment value 20R  (hidden comment: Thick film)
20.00; Tolerance [%]: ±5; Power Rating [W]: 0.1; Case [EIA]: 0805; Case [Metric]: 2012; Value [Ω]: 20.00
footprint RES_0805
pins: 1, 2
1 alternate drawing of the same symbol

## RES_22k_5%_0603
designator R?, comment value 22k  (hidden comment: Thick film)
22000.00; Tolerance [%]: ±5; Power Rating [W]: 0.1; Case [EIA]: 0603; Case [Metric]: 1608; Value [Ω]: 22000.00
footprint RES_0603
pins: 1, 2
1 alternate drawing of the same symbol

## RES_22k_5%_0805
designator R?, comment value 22k  (hidden comment: Thick film)
22000.00; Tolerance [%]: ±5; Power Rating [W]: 0.1; Case [EIA]: 0805; Case [Metric]: 2012; Value [Ω]: 22000.00
footprint RES_0805
pins: 1, 2
1 alternate drawing of the same symbol

## RES_22R_5%_0603
designator R?, comment value 22R  (hidden comment: Thick film)
22.00; Tolerance [%]: ±5; Power Rating [W]: 0.1; Case [EIA]: 0603; Case [Metric]: 1608; Value [Ω]: 22.00
footprint RES_0603
pins: 1, 2
1 alternate drawing of the same symbol

## RES_22R_5%_0805
designator R?, comment value 22R  (hidden comment: Thick film)
22.00; Tolerance [%]: ±5; Power Rating [W]: 0.1; Case [EIA]: 0805; Case [Metric]: 2012; Value [Ω]: 22.00
footprint RES_0805
pins: 1, 2
1 alternate drawing of the same symbol

## RES_24k_5%_0603
designator R?, comment value 24k  (hidden comment: Thick film)
24000.00; Tolerance [%]: ±5; Power Rating [W]: 0.1; Case [EIA]: 0603; Case [Metric]: 1608; Value [Ω]: 24000.00
footprint RES_0603
pins: 1, 2
1 alternate drawing of the same symbol

## RES_24k_5%_0805
designator R?, comment value 24k  (hidden comment: Thick film)
24000.00; Tolerance [%]: ±5; Power Rating [W]: 0.1; Case [EIA]: 0805; Case [Metric]: 2012; Value [Ω]: 24000.00
footprint RES_0805
pins: 1, 2
1 alternate drawing of the same symbol

## RES_24R_5%_0603
designator R?, comment value 24R  (hidden comment: Thick film)
24.00; Tolerance [%]: ±5; Power Rating [W]: 0.1; Case [EIA]: 0603; Case [Metric]: 1608; Value [Ω]: 24.00
footprint RES_0603
pins: 1, 2
1 alternate drawing of the same symbol

## RES_24R_5%_0805
designator R?, comment value 24R  (hidden comment: Thick film)
24.00; Tolerance [%]: ±5; Power Rating [W]: 0.1; Case [EIA]: 0805; Case [Metric]: 2012; Value [Ω]: 24.00
footprint RES_0805
pins: 1, 2
1 alternate drawing of the same symbol

## RES_27k_5%_0603
designator R?, comment value 27k  (hidden comment: Thick film)
27000.00; Tolerance [%]: ±5; Power Rating [W]: 0.1; Case [EIA]: 0603; Case [Metric]: 1608; Value [Ω]: 27000.00
footprint RES_0603
pins: 1, 2
1 alternate drawing of the same symbol

## RES_27k_5%_0805
designator R?, comment value 27k  (hidden comment: Thick film)
27000.00; Tolerance [%]: ±5; Power Rating [W]: 0.1; Case [EIA]: 0805; Case [Metric]: 2012; Value [Ω]: 27000.00
footprint RES_0805
pins: 1, 2
1 alternate drawing of the same symbol

## RES_27R_5%_0603
designator R?, comment value 27R  (hidden comment: Thick film)
27.00; Tolerance [%]: ±5; Power Rating [W]: 0.1; Case [EIA]: 0603; Case [Metric]: 1608; Value [Ω]: 27.00
footprint RES_0603
pins: 1, 2
1 alternate drawing of the same symbol

## RES_27R_5%_0805
designator R?, comment value 27R  (hidden comment: Thick film)
27.00; Tolerance [%]: ±5; Power Rating [W]: 0.1; Case [EIA]: 0805; Case [Metric]: 2012; Value [Ω]: 27.00
footprint RES_0805
pins: 1, 2
1 alternate drawing of the same symbol